# Altium footprint library B-NT_CHIPS.PcbLib: 90 footprints (part 4 of 6)
Each footprint in its own frame and in the unit in brackets; x right, y up, seen from the top. Pads: shape width x height; smd on the part's side, far side on the other; paste and mask are expansions set on the pad; w line width, h text height; cw(c..) or ccw(c..) is an arc to the next point about the centre after c.
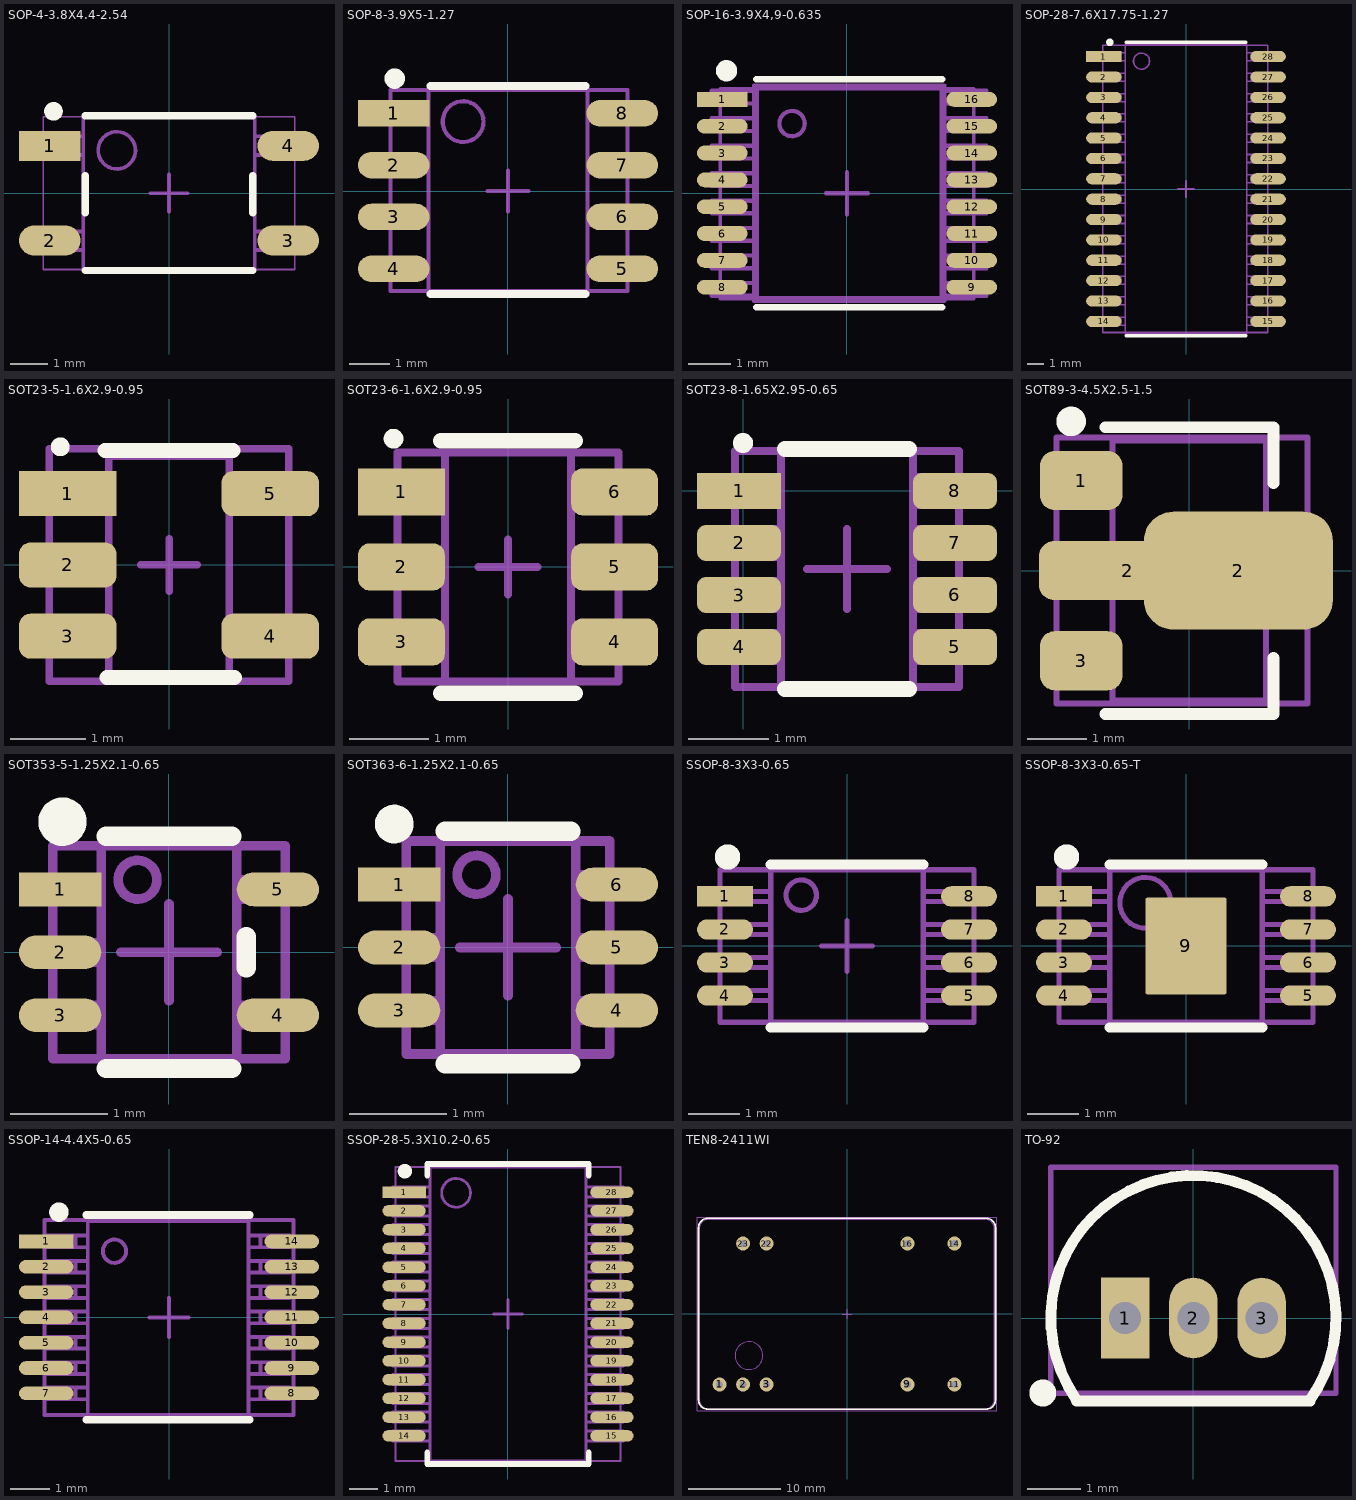
[diagram p3: the footprints below, top view; thin cyan lines are the x and y axes]

## SOP-4-3.8X4.4-2.54 [mm] "SOP, 4-Leads, Body 3,80x4,40mm, Pitch 2,54mm, IPC Medium Density"
height 2.3
pads (4):
  rect 1.65x0.8 smd: 1(-3.2,1.27)
  oval 1.65x0.8 smd: 2(-3.2,-1.27) 3(3.2,-1.27) 4(3.2,1.27)
Top Overlay:
  circle w0.25: c-3.1,2.195 r0.125
  lines w0.2: -2.25,-2.075 2.25,-2.075 ; -2.25,-0.525 -2.25,0.475 ; -2.25,2.075 2.25,2.075 ; 2.25,-0.525 2.25,0.475
M3 Top Assy:
  circle w0.1: c-1.4,1.15 r0.5
  lines w0.1: -2.3,-1.525 -3.35,-1.525 -3.35,-1.025 -2.3,-1.025 ; -2.3,1.025 -3.35,1.025 -3.35,1.525 -2.3,1.525 ; 2.3,-1.525 3.35,-1.525 3.35,-1.025 2.3,-1.025 ; 2.3,1.025 3.35,1.025 3.35,1.525 2.3,1.525 ; -2.3,-2.05 2.3,-2.05 2.3,2.05 -2.3,2.05 -2.3,-2.05
M8 Top Brd Anno:
  lines w0.05: -3.375,-2.05 3.375,-2.05 3.375,2.05 -3.375,2.05 -3.375,-2.05
  lines w0.1: -0.5,0 0.5,0 ; 0,-0.5 0,0.5
3D body "SOP254P680X230-4N.step": height 2.3, standoff 0, extent -3.375,-2.05 3.375,2.05

## SOP-8-3.9X5-1.27 [mm] "SOIC, 8-Leads, Body 5x4mm, Pitch 1.27mm, IPC Medium Density"
height 1.8
pads (8):
  rect 1.75x0.65 smd: 1(-2.8,1.905)
  oval 1.75x0.65 smd: 2(-2.8,0.635) 3(-2.8,-0.635) 4(-2.8,-1.905) 5(2.8,-1.905) 6(2.8,-0.635) 7(2.8,0.635) 8(2.8,1.905)
Top Overlay:
  circle w0.25: c-2.775,2.755 r0.125
  lines w0.2: -1.9,-2.525 1.9,-2.525 ; -1.9,2.575 1.9,2.575
M3 Top Assy:
  circle w0.1: c-1.1,1.7 r0.5
  lines w0.1: -1.95,-2.075 -3,-2.075 -3,-1.725 -1.95,-1.725 ; -1.95,-0.8 -3,-0.8 -3,-0.45 -1.95,-0.45 ; -1.95,0.475 -3,0.475 -3,0.825 -1.95,0.825 ; -1.95,1.725 -3,1.725 -3,2.075 -1.95,2.075 ; 1.95,-2.075 3,-2.075 3,-1.725 1.95,-1.725 ; 1.95,-0.825 3,-0.825 3,-0.475 1.95,-0.475 ; 1.95,0.45 3,0.45 3,0.8 1.95,0.8 ; 1.95,1.725 3,1.725 3,2.075 1.95,2.075 ; -1.95,-2.5 -1.95,2.5 1.95,2.5 1.95,-2.5 -1.95,-2.5
M8 Top Brd Anno:
  lines w0.1: -0.5,0 0.5,0 ; 0,-0.5 0,0.5 ; -2.875,-2.45 -2.875,2.475 2.925,2.475 2.925,-2.45 -2.875,-2.45
3D body "CircuitWorks-SO-8.step": height 1.45, standoff 0, extent -2.86,-2.443 2.918,2.459

## SOP-16-3.9X4,9-0.635 [mm] "QSOP, 16 Leads, Body 5x4mm (max), Pitch 0.635mm"
height 1.75
pads (16):
  rect 1.2x0.35 smd: 1(-2.95,2.222)
  oval 1.2x0.35 smd: 2(-2.95,1.587) 3(-2.95,0.953) 4(-2.95,0.318) 5(-2.95,-0.318) 6(-2.95,-0.953) 7(-2.95,-1.587) 8(-2.95,-2.222) 9(2.95,-2.222) 10(2.95,-1.587) 11(2.95,-0.953) 12(2.95,-0.318) 13(2.95,0.318) 14(2.95,0.953) 15(2.95,1.587) 16(2.95,2.222)
Top Overlay:
  circle w0.25: c-2.85,2.9 r0.125
  lines w0.152: -2.15,-2.7 2.25,-2.7 ; -2.15,2.7 2.25,2.7
M3 Top Assy:
  circle w0.1: c-1.3,1.65 r0.3
  lines w0.1: -2.789,-2.425 -2.789,-2.125 ; -2.789,-1.775 -2.789,-1.475 ; -2.789,-1.125 -2.789,-0.825 ; -2.789,-0.475 -2.789,-0.175 ; -2.789,0.175 -2.789,0.475 ; -2.789,0.825 -2.789,1.125 ; -2.789,1.475 -2.789,1.775 ; -2.789,2.125 -2.789,2.425 ; -2.745,-2.425 -2.745,-2.125 ; -2.745,-1.775 -2.745,-1.475 ; -2.745,-1.125 -2.745,-0.825 ; -2.745,-0.475 -2.745,-0.175 ; -2.745,0.175 -2.745,0.475 ; -2.745,0.825 -2.745,1.125 ; -2.745,1.475 -2.745,1.775 ; -2.745,2.125 -2.745,2.425 ; -2.643,-2.425 -2.643,-2.125 ; -2.643,-1.775 -2.643,-1.475 ; -2.643,-1.125 -2.643,-0.825 ; -2.643,-0.475 -2.643,-0.175 ; -2.643,0.175 -2.643,0.475 ; -2.643,0.825 -2.643,1.125 ; -2.643,1.475 -2.643,1.775 ; -2.643,2.125 -2.643,2.425 ; -2.45,-2.425 -2.45,-2.125 ; -2.45,-1.775 -2.45,-1.475 ; -2.45,-1.125 -2.45,-0.825 ; -2.45,-0.475 -2.45,-0.175 ; -2.45,0.175 -2.45,0.475 ; -2.45,0.825 -2.45,1.125 ; -2.45,1.475 -2.45,1.775 ; -2.45,2.125 -2.45,2.425 ; -2.2,-2.425 -3.2,-2.425 -3.2,-2.125 -2.2,-2.125 ; -2.2,-1.775 -3.2,-1.775 -3.2,-1.475 -2.2,-1.475 ; -2.2,-1.125 -3.2,-1.125 -3.2,-0.825 -2.2,-0.825 ; -2.2,-0.475 -3.2,-0.475 -3.2,-0.175 -2.2,-0.175 ; -2.2,0.175 -3.2,0.175 -3.2,0.475 -2.2,0.475 ; -2.2,0.825 -3.2,0.825 -3.2,1.125 -2.2,1.125 ; -2.2,1.475 -3.2,1.475 -3.2,1.775 -2.2,1.775 ; -2.2,2.125 -3.2,2.125 -3.2,2.425 -2.2,2.425 ; 2.3,-2.425 3.3,-2.425 3.3,-2.125 2.3,-2.125 ; 2.3,-1.775 3.3,-1.775 3.3,-1.475 2.3,-1.475 ; 2.3,-1.125 3.3,-1.125 3.3,-0.825 2.3,-0.825 ; 2.3,-0.475 3.3,-0.475 3.3,-0.175 2.3,-0.175 ; 2.3,0.175 3.3,0.175 3.3,0.475 2.3,0.475 ; 2.3,0.825 3.3,0.825 3.3,1.125 2.3,1.125 ; 2.3,1.475 3.3,1.475 3.3,1.775 2.3,1.775 ; 2.3,2.125 3.3,2.125 3.3,2.425 2.3,2.425 ; 2.55,-2.425 2.55,-2.125 ; 2.55,-1.775 2.55,-1.475 ; 2.55,-1.125 2.55,-0.825 ; 2.55,-0.475 2.55,-0.175 ; 2.55,0.175 2.55,0.475 ; 2.55,0.825 2.55,1.125 ; 2.55,1.475 2.55,1.775 ; 2.55,2.125 2.55,2.425 ; 2.743,-2.425 2.743,-2.125 ; 2.743,-1.775 2.743,-1.475 ; 2.743,-1.125 2.743,-0.825 ; 2.743,-0.475 2.743,-0.175 ; 2.743,0.175 2.743,0.475 ; 2.743,0.825 2.743,1.125 ; 2.743,1.475 2.743,1.775 ; 2.743,2.125 2.743,2.425 ; 2.845,-2.425 2.845,-2.125 ; 2.845,-1.775 2.845,-1.475 ; 2.845,-1.125 2.845,-0.825 ; 2.845,-0.475 2.845,-0.175 ; 2.845,0.175 2.845,0.475 ; 2.845,0.825 2.845,1.125 ; 2.845,1.475 2.845,1.775 ; 2.845,2.125 2.845,2.425 ; 2.889,-2.425 2.889,-2.125 ; 2.889,-1.775 2.889,-1.475 ; 2.889,-1.125 2.889,-0.825 ; 2.889,-0.475 2.889,-0.175 ; 2.889,0.175 2.889,0.475 ; 2.889,0.825 2.889,1.125 ; 2.889,1.475 2.889,1.775 ; 2.889,2.125 2.889,2.425 ; -2.2,-2.55 2.3,-2.55 ; -2.2,-2.55 -2.137,-2.487 ; -2.2,-2.55 -2.2,2.55 ; -2.2,2.55 -2.137,2.487 ; -2.2,2.55 2.3,2.55 ; -2.137,-2.487 2.237,-2.487 ; -2.137,-2.487 -2.137,2.487 ; -2.137,2.487 2.237,2.487 ; 2.237,-2.487 2.3,-2.55 ; 2.237,-2.487 2.237,2.487 ; 2.237,2.487 2.3,2.55 ; 2.3,-2.55 2.3,2.55
M8 Top Brd Anno:
  lines w0.076: -3,-2.5 3,-2.5 3,2.475 -3,2.475 -3,-2.5
  lines w0.1: -0.5,0 0.5,0 ; 0,-0.5 0,0.5
3D body "User Library-MAX_QSOP16.STEP": height 1.76, standoff -0.01, extent -3.01,-2.49 3.01,2.49

## SOP-28-7.6X17.75-1.27 [mm]
height 3
pads (28):
  rect 2.2x0.7 smd: 1(-5.125,8.255)
  oval 2.2x0.7 smd: 2(-5.125,6.985) 3(-5.125,5.715) 4(-5.125,4.445) 5(-5.125,3.175) 6(-5.125,1.905) 7(-5.125,0.635) 8(-5.125,-0.635) 9(-5.125,-1.905) 10(-5.125,-3.175) 11(-5.125,-4.445) 12(-5.125,-5.715) 13(-5.125,-6.985) 14(-5.125,-8.255) 15(5.125,-8.255) 16(5.125,-6.985) 17(5.125,-5.715) 18(5.125,-4.445) 19(5.125,-3.175) 20(5.125,-1.905) 21(5.125,-0.635) 22(5.125,0.635) 23(5.125,1.905) 24(5.125,3.175) 25(5.125,4.445) 26(5.125,5.715) 27(5.125,6.985) 28(5.125,8.255)
Top Overlay:
  circle w0.25: c-4.75,9.15 r0.103
  lines w0.2: -3.75,-9.15 3.75,-9.15 ; -3.75,9.15 3.75,9.15
M3 Top Assy:
  drawing of 313 lines, arcs and shapes, not listed
M8 Top Brd Anno:
  lines w0.1: -0.5,0 0.5,0 ; 0,-0.5 0,0.5 ; -5.2,-8.95 -5.2,8.975 5.1,8.975 5.1,-8.95 -5.2,-8.95
3D body "SW3dPS-SOIC28-300.STEP": height 2.65, standoff 0, extent -5.2,-8.95 5.1,8.95

## SOT23-5-1.6X2.9-0.95 [mm] "SOT, 6-Leads, Body 2,9x1,6mm, Pitch 0,95mm"
height 1.1
pads (5):
  rect 1.3x0.6 smd: 1(-1.35,0.95)
  rrect50% 1.3x0.6 smd: 2(-1.35,0) 3(-1.35,-0.95) 4(1.35,-0.95) 5(1.35,0.95)
Top Overlay:
  circle w0.15: c-1.45,1.575 r0.05
  lines w0.2: -0.85,1.525 0.85,1.525 ; -0.825,-1.5 0.875,-1.5
M3 Top Assy:
  lines w0.1: -0.8,-1.075 -1.4,-1.075 -1.4,-0.775 -0.8,-0.775 ; -0.8,-0.125 -1.4,-0.125 -1.4,0.175 -0.8,0.175 ; -0.8,0.825 -1.4,0.825 -1.4,1.125 -0.8,1.125 ; 0.8,-1.1 1.4,-1.1 1.4,-0.8 0.8,-0.8 ; 0.8,0.8 1.4,0.8 1.4,1.1 0.8,1.1 ; -0.8,-1.45 0.8,-1.45 0.8,1.45 -0.8,1.45 -0.8,-1.45
M8 Top Brd Anno:
  lines w0.1: -0.375,0 0.375,0 ; 0,-0.35 0,0.35 ; -1.6,-1.55 -1.6,1.55 1.6,1.55 1.6,-1.55 -1.6,-1.55
3D body "STEP-WE-TVS-HS-SOT23-6L-rev1.stp": height 1.06, standoff -0.1, extent -1.4,-1.45 1.4,1.45
3D body "User Library-SOT23-5-3.STEP": height 1.45, standoff 0.01, extent -1.6,-1.55 1.6,1.55

## SOT23-6-1.6X2.9-0.95 [mm] "SOT, 6-Leads, Body 2,9x1,6mm, Pitch 0,95mm"
height 1.1
pads (6):
  rect 1.1x0.6 smd: 1(-1.35,0.95)
  rrect50% 1.1x0.6 smd: 2(-1.35,0) 3(-1.35,-0.95) 4(1.35,-0.95) 5(1.35,0) 6(1.35,0.95)
Top Overlay:
  circle w0.15: c-1.45,1.625 r0.05
  lines w0.2: -0.85,-1.6 0.85,-1.6 ; -0.85,1.6 0.85,1.6
M3 Top Assy:
  lines w0.1: -0.8,-1.075 -1.4,-1.075 -1.4,-0.775 -0.8,-0.775 ; -0.8,-0.125 -1.4,-0.125 -1.4,0.175 -0.8,0.175 ; -0.8,0.825 -1.4,0.825 -1.4,1.125 -0.8,1.125 ; 0.8,-1.1 1.4,-1.1 1.4,-0.8 0.8,-0.8 ; 0.8,0.8 1.4,0.8 1.4,1.1 0.8,1.1 ; 0.825,-0.15 1.425,-0.15 1.425,0.15 0.825,0.15 ; -0.8,-1.45 -0.8,1.45 0.8,1.45 0.8,-1.45 -0.8,-1.45
M8 Top Brd Anno:
  lines w0.1: -0.375,0 0.375,0 ; 0,-0.35 0,0.35 ; -1.4,-1.45 1.4,-1.45 1.4,1.45 -1.4,1.45 -1.4,-1.45
3D body "STEP-WE-TVS-HS-SOT23-6L-rev1.stp": height 1.16, standoff 0, extent -1.4,-1.45 1.4,1.45
3D body "STEP-WE-TVS-HS-SOT23-6L-rev1.stp": height 1.06, standoff -0.1, extent -1.4,-1.45 1.4,1.45

## SOT23-8-1.65X2.95-0.65 [mm] "SOT23, 8-Leads, Body 2,95x1,65mm, Pitch 0,65mm, IPC Medium Density"
height 1.1
pads (8):
  rect 1.05x0.45 smd: 1(-0.05,0)
  rrect50% 1.05x0.45 smd: 2(-0.05,-0.65) 3(-0.05,-1.3) 4(-0.05,-1.95) 5(2.65,-1.95) 6(2.65,-1.3) 7(2.65,-0.65) 8(2.65,0)
Top Overlay:
  circle w0.15: c0,0.6 r0.05
  lines w0.2: 0.525,-2.475 2.075,-2.475 ; 0.525,0.525 2.075,0.525
M3 Top Assy:
  lines w0.1: 0.475,-2.125 -0.1,-2.125 -0.1,-1.775 0.475,-1.775 ; 0.475,-1.475 -0.1,-1.475 -0.1,-1.125 0.475,-1.125 ; 0.475,-0.825 -0.1,-0.825 -0.1,-0.475 0.475,-0.475 ; 0.475,-0.175 -0.1,-0.175 -0.1,0.175 0.475,0.175 ; 2.125,-2.125 2.7,-2.125 2.7,-1.775 2.125,-1.775 ; 2.125,-1.475 2.7,-1.475 2.7,-1.125 2.125,-1.125 ; 2.125,-0.825 2.7,-0.825 2.7,-0.475 2.125,-0.475 ; 2.125,-0.175 2.7,-0.175 2.7,0.175 2.125,0.175 ; 0.475,-2.45 2.125,-2.45 2.125,0.5 0.475,0.5 0.475,-2.45
M8 Top Brd Anno:
  lines w0.1: 0.8,-0.975 1.8,-0.975 ; 1.3,-1.475 1.3,-0.475 ; -0.1,-2.45 -0.1,0.5 2.7,0.5 2.7,-2.45 -0.1,-2.45
3D body "User Library-sot238.step": height 1.2, standoff 0, extent -0.1,-2.445 2.7,0.495

## SOT89-3-4.5X2.5-1.5 [mm] "SOT89, Body 4.5x2.5mm, Pitch 1.5mm"
height 1
pads (4):
  rrect50% 1.4x1 smd: 1(-1.829,1.524) 3(-1.829,-1.524)
  rrect50% 3x1 smd: 2(-1.042,0)
  rrect50% 3.2x2 smd: 2(0.829,0)
Top Overlay:
  circle w0.25: c-2,2.525 r0.125
  lines w0.2: -1.422,-2.426 1.425,-2.426 ; -1.422,2.426 1.422,2.426 1.422,1.478 ; 1.422,-2.426 1.422,-1.478
M3 Top Assy:
  lines w0.1: -1.3,-1.8 -2.025,-1.8 -2.025,-1.3 -1.3,-1.3 ; -1.3,-0.25 -2.025,-0.25 -2.025,0.25 -1.3,0.25 ; -1.3,1.3 -2.025,1.3 -2.025,1.8 -1.3,1.8 ; 1.3,-0.7 2.025,-0.7 2.025,0.7 1.3,0.7 ; -1.3,-2.2 1.3,-2.2 1.3,2.2 -1.3,2.2 -1.3,-2.2
M8 Top Brd Anno:
  lines w0.1: -0.5,0 0.5,0 ; 0,-0.5 0,0.5 ; -2.25,-2.25 2,-2.25 2,2.25 -2.25,2.25 -2.25,-2.25
3D body "User Library-SOT89-3.STEP": height 1.54, standoff 0, extent -2.25,-2.25 2,2.25

## SOT353-5-1.25X2.1-0.65 [mm] "SC-70-5, 0.65 PITCH"
height 2.3
pads (5):
  rect 0.85x0.35 smd: 1(-1.125,0.65)
  oval 0.85x0.35 smd: 2(-1.125,0) 3(-1.125,-0.65) 4(1.125,-0.65) 5(1.125,0.65)
Top Overlay:
  circle w0.25: c-1.1,1.35 r0.125
  lines w0.2: -0.65,-1.2 0.65,-1.2 ; -0.65,1.2 0.65,1.2 ; 0.8,-0.163 0.8,0.162
M3 Top Assy:
  circle w0.1: c-0.325,0.75 r0.2
  lines w0.1: -0.7,-0.75 -1.225,-0.75 -1.225,-0.55 -0.7,-0.55 ; -0.7,-0.1 -1.225,-0.1 -1.225,0.1 -0.7,0.1 ; -0.7,0.55 -1.225,0.55 -1.225,0.75 -0.7,0.75 ; 0.7,-0.75 1.225,-0.75 1.225,-0.55 0.7,-0.55 ; 0.7,0.55 1.225,0.55 1.225,0.75 0.7,0.75 ; -0.7,-1.1 0.7,-1.1 0.7,1.1 -0.7,1.1 -0.7,-1.1
M8 Top Brd Anno:
  lines w0.1: -0.5,0 0.5,0 ; 0,-0.5 0,0.5 ; -1.2,-1.1 1.2,-1.1 1.2,1.1 -1.2,1.1 -1.2,-1.1
3D body "SOT353.STEP": height 1.1, standoff 0, extent -1.2,-1.1 1.2,1.1

## SOT363-6-1.25X2.1-0.65 [mm] "TSOP, 6-Leads, Body 2,00x1,25mm, Pitch 0,65mm, IPC Medium Density"
height 1.1
pads (6):
  rect 0.85x0.35 smd: 1(-1.125,0.65)
  oval 0.85x0.35 smd: 2(-1.125,0) 3(-1.125,-0.65) 4(1.125,-0.65) 5(1.125,0) 6(1.125,0.65)
Top Overlay:
  circle w0.2: c-1.175,1.275 r0.1
  lines w0.2: -0.65,-1.2 0.65,-1.2 ; -0.65,1.2 0.65,1.2
M3 Top Assy:
  circle w0.1: c-0.325,0.75 r0.2
  lines w0.1: -0.7,-0.75 -1.225,-0.75 -1.225,-0.55 -0.7,-0.55 ; -0.7,-0.1 -1.225,-0.1 -1.225,0.1 -0.7,0.1 ; -0.7,0.55 -1.225,0.55 -1.225,0.75 -0.7,0.75 ; 0.7,-0.75 1.225,-0.75 1.225,-0.55 0.7,-0.55 ; 0.7,-0.1 1.225,-0.1 1.225,0.1 0.7,0.1 ; 0.7,0.55 1.225,0.55 1.225,0.75 0.7,0.75 ; -0.7,-1.1 -0.7,1.1 0.7,1.1 0.7,-1.1 -0.7,-1.1
M8 Top Brd Anno:
  lines w0.1: -0.5,0 0.5,0 ; 0,-0.5 0,0.5 ; -1.05,-1.1 1.05,-1.1 1.05,1.1 -1.05,1.1 -1.05,-1.1
3D body "TSOP65P210X110-6N.step": height 1.08, standoff -0.02, extent -1.05,-1.1 1.05,1.1

## SSOP-8-3X3-0.65 [mm] "MSOP, 8-Leads, Body 3,00x3,00mm, Pitch 0,65mm, IPC Medium Density"
height 1.2
pads (8):
  rect 1.1x0.4 smd: 1(-2.4,0.975)
  oval 1.1x0.4 smd: 2(-2.4,0.325) 3(-2.4,-0.325) 4(-2.4,-0.975) 5(2.4,-0.975) 6(2.4,-0.325) 7(2.4,0.325) 8(2.4,0.975)
Top Overlay:
  circle w0.25: c-2.35,1.75 r0.125
  lines w0.2: -1.5,-1.6 1.5,-1.6 ; -1.5,1.6 1.5,1.6
M3 Top Assy:
  circle w0.1: c-0.9,1 r0.3
  lines w0.1: -1.5,-1.075 -2.45,-1.075 -2.45,-0.875 -1.5,-0.875 ; -1.5,-0.425 -2.45,-0.425 -2.45,-0.225 -1.5,-0.225 ; -1.5,0.225 -2.45,0.225 -2.45,0.425 -1.5,0.425 ; -1.5,0.875 -2.45,0.875 -2.45,1.075 -1.5,1.075 ; 1.5,-1.075 2.45,-1.075 2.45,-0.875 1.5,-0.875 ; 1.5,-0.425 2.45,-0.425 2.45,-0.225 1.5,-0.225 ; 1.5,0.225 2.45,0.225 2.45,0.425 1.5,0.425 ; 1.5,0.875 2.45,0.875 2.45,1.075 1.5,1.075 ; -1.5,-1.5 1.5,-1.5 1.5,1.5 -1.5,1.5 -1.5,-1.5
M8 Top Brd Anno:
  lines w0.1: -0.5,0 0.5,0 ; 0,-0.5 0,0.5 ; -2.5,-1.5 2.5,-1.5 2.5,1.5 -2.5,1.5 -2.5,-1.5
3D body "User Library-MSOP-8-2.STEP": height 1.05, standoff -0.02, extent -2.51,-1.5 2.511,1.5

## SSOP-8-3X3-0.65-T [mm] "MSOP, 8-Leads, Body 3,00x3,00mm, Pitch 0,65mm, IPC Medium Density"
height 1.1
pads (9):
  rect 1.1x0.4 smd: 1(-2.4,0.975)
  oval 1.1x0.4 smd: 2(-2.4,0.325) 3(-2.4,-0.325) 4(-2.4,-0.975) 5(2.4,-0.975) 6(2.4,-0.325) 7(2.4,0.325) 8(2.4,0.975)
  rrect5% 1.6x1.9 smd: 9(0,0)
Top Overlay:
  circle w0.25: c-2.35,1.75 r0.125
  lines w0.2: -1.5,-1.6 1.5,-1.6 ; -1.5,1.6 1.5,1.6
M3 Top Assy:
  circle w0.1: c-0.8,0.85 r0.5
  lines w0.1: -1.5,-1.075 -2.45,-1.075 -2.45,-0.875 -1.5,-0.875 ; -1.5,-0.425 -2.45,-0.425 -2.45,-0.225 -1.5,-0.225 ; -1.5,0.225 -2.45,0.225 -2.45,0.425 -1.5,0.425 ; -1.5,0.875 -2.45,0.875 -2.45,1.075 -1.5,1.075 ; 1.5,-1.075 2.45,-1.075 2.45,-0.875 1.5,-0.875 ; 1.5,-0.425 2.45,-0.425 2.45,-0.225 1.5,-0.225 ; 1.5,0.225 2.45,0.225 2.45,0.425 1.5,0.425 ; 1.5,0.875 2.45,0.875 2.45,1.075 1.5,1.075 ; -1.5,-1.5 1.5,-1.5 1.5,1.5 -1.5,1.5 -1.5,-1.5
M8 Top Brd Anno:
  lines w0.1: -0.5,0 0.5,0 ; 0,-0.5 0,0.5 ; -2.5,-1.5 2.5,-1.5 2.5,1.5 -2.5,1.5 -2.5,-1.5
3D body "User Library-MSOP-8-2.STEP": height 1, standoff -0.07, extent -2.51,-1.5 2.511,1.5

## SSOP-14-4.4X5-0.65 [mm] "TSSOP, 14-Leads, Body 5.0x4.5mm (max), Pitch 0.65mm, IPC Medium Density"
height 1.2
pads (14):
  rect 1.4x0.35 smd: 1(-3.15,1.95)
  oval 1.4x0.35 smd: 2(-3.15,1.3) 3(-3.15,0.65) 4(-3.15,0) 5(-3.15,-0.65) 6(-3.15,-1.3) 7(-3.15,-1.95) 8(3.15,-1.95) 9(3.15,-1.3) 10(3.15,-0.65) 11(3.15,0) 12(3.15,0.65) 13(3.15,1.3) 14(3.15,1.95)
Top Overlay:
  circle w0.25: c-2.825,2.7 r0.125
  lines w0.2: -2.125,-2.625 2.075,-2.625 ; -2.125,2.625 2.075,2.625
M3 Top Assy:
  circle w0.1: c-1.4,1.7 r0.3
  lines w0.1: -2.739,-2.1 -2.739,-1.8 ; -2.739,-1.45 -2.739,-1.15 ; -2.739,-0.8 -2.739,-0.5 ; -2.739,-0.15 -2.739,0.15 ; -2.739,0.5 -2.739,0.8 ; -2.739,1.15 -2.739,1.45 ; -2.739,1.8 -2.739,2.1 ; -2.695,-2.1 -2.695,-1.8 ; -2.695,-1.45 -2.695,-1.15 ; -2.695,-0.8 -2.695,-0.5 ; -2.695,-0.15 -2.695,0.15 ; -2.695,0.5 -2.695,0.8 ; -2.695,1.15 -2.695,1.45 ; -2.695,1.8 -2.695,2.1 ; -2.593,-2.1 -2.593,-1.8 ; -2.593,-1.45 -2.593,-1.15 ; -2.593,-0.8 -2.593,-0.5 ; -2.593,-0.15 -2.593,0.15 ; -2.593,0.5 -2.593,0.8 ; -2.593,1.15 -2.593,1.45 ; -2.593,1.8 -2.593,2.1 ; -2.4,-2.1 -2.4,-1.8 ; -2.4,-1.45 -2.4,-1.15 ; -2.4,-0.8 -2.4,-0.5 ; -2.4,-0.15 -2.4,0.15 ; -2.4,0.5 -2.4,0.8 ; -2.4,1.15 -2.4,1.45 ; -2.4,1.8 -2.4,2.1 ; -2.15,-2.1 -3.15,-2.1 -3.15,-1.8 -2.15,-1.8 ; -2.15,-1.45 -3.15,-1.45 -3.15,-1.15 -2.15,-1.15 ; -2.15,-0.8 -3.15,-0.8 -3.15,-0.5 -2.15,-0.5 ; -2.15,-0.15 -3.15,-0.15 -3.15,0.15 -2.15,0.15 ; -2.15,0.5 -3.15,0.5 -3.15,0.8 -2.15,0.8 ; -2.15,1.15 -3.15,1.15 -3.15,1.45 -2.15,1.45 ; -2.15,1.8 -3.15,1.8 -3.15,2.1 -2.15,2.1 ; 2.1,-2.1 3.1,-2.1 3.1,-1.8 2.1,-1.8 ; 2.1,-1.45 3.1,-1.45 3.1,-1.15 2.1,-1.15 ; 2.1,-0.8 3.1,-0.8 3.1,-0.5 2.1,-0.5 ; 2.1,-0.15 3.1,-0.15 3.1,0.15 2.1,0.15 ; 2.1,0.5 3.1,0.5 3.1,0.8 2.1,0.8 ; 2.1,1.15 3.1,1.15 3.1,1.45 2.1,1.45 ; 2.1,1.8 3.1,1.8 3.1,2.1 2.1,2.1 ; 2.35,-2.1 2.35,-1.8 ; 2.35,-1.45 2.35,-1.15 ; 2.35,-0.8 2.35,-0.5 ; 2.35,-0.15 2.35,0.15 ; 2.35,0.5 2.35,0.8 ; 2.35,1.15 2.35,1.45 ; 2.35,1.8 2.35,2.1 ; 2.543,-2.1 2.543,-1.8 ; 2.543,-1.45 2.543,-1.15 ; 2.543,-0.8 2.543,-0.5 ; 2.543,-0.15 2.543,0.15 ; 2.543,0.5 2.543,0.8 ; 2.543,1.15 2.543,1.45 ; 2.543,1.8 2.543,2.1 ; 2.645,-2.1 2.645,-1.8 ; 2.645,-1.45 2.645,-1.15 ; 2.645,-0.8 2.645,-0.5 ; 2.645,-0.15 2.645,0.15 ; 2.645,0.5 2.645,0.8 ; 2.645,1.15 2.645,1.45 ; 2.645,1.8 2.645,2.1 ; 2.689,-2.1 2.689,-1.8 ; 2.689,-1.45 2.689,-1.15 ; 2.689,-0.8 2.689,-0.5 ; 2.689,-0.15 2.689,0.15 ; 2.689,0.5 2.689,0.8 ; 2.689,1.15 2.689,1.45 ; 2.689,1.8 2.689,2.1 ; -2.087,-2.525 -2.087,2.475 2.037,2.475 2.037,-2.525 -2.087,-2.525
M8 Top Brd Anno:
  lines w0.1: -0.5,0 0.5,0 ; 0,-0.5 0,0.5 ; -3.2,-2.5 -3.2,2.5 3.2,2.5 3.2,-2.5 -3.2,-2.5
3D body "User Library-TSSOP14-1.step": height 1.1, standoff 0, extent -3.2,-2.5 3.2,2.5

## SSOP-28-5.3X10.2-0.65 [mm] "28-SSOP (0.209\", 5.30mm Width)"
height 3
pads (28):
  rect 1.5x0.4 smd: 1(-3.6,4.225)
  oval 1.5x0.4 smd: 2(-3.6,3.575) 3(-3.6,2.925) 4(-3.6,2.275) 5(-3.6,1.625) 6(-3.6,0.975) 7(-3.6,0.325) 8(-3.6,-0.325) 9(-3.6,-0.975) 10(-3.6,-1.625) 11(-3.6,-2.275) 12(-3.6,-2.925) 13(-3.6,-3.575) 14(-3.6,-4.225) 15(3.6,-4.225) 16(3.6,-3.575) 17(3.6,-2.925) 18(3.6,-2.275) 19(3.6,-1.625) 20(3.6,-0.975) 21(3.6,-0.325) 22(3.6,0.325) 23(3.6,0.975) 24(3.6,1.625) 25(3.6,2.275) 26(3.6,2.925) 27(3.6,3.575) 28(3.6,4.225)
Top Overlay:
  circle w0.25: c-3.575,4.95 r0.125
  lines w0.2: -2.8,-4.8 -2.8,-5.2 2.8,-5.2 2.8,-4.8 ; -2.8,4.8 -2.8,5.2 2.8,5.2 2.8,4.8
M3 Top Assy:
  circle w0.1: c-1.8,4.2 r0.5
  lines w0.1: -2.75,-4.4 -4,-4.4 -4,-4.05 -2.75,-4.05 ; -2.75,-3.75 -4,-3.75 -4,-3.4 -2.75,-3.4 ; -2.75,-3.1 -4,-3.1 -4,-2.75 -2.75,-2.75 ; -2.75,-2.45 -4,-2.45 -4,-2.1 -2.75,-2.1 ; -2.75,-1.8 -4,-1.8 -4,-1.45 -2.75,-1.45 ; -2.75,-1.15 -4,-1.15 -4,-0.8 -2.75,-0.8 ; -2.75,-0.5 -4,-0.5 -4,-0.15 -2.75,-0.15 ; -2.75,0.15 -4,0.15 -4,0.5 -2.75,0.5 ; -2.75,0.8 -4,0.8 -4,1.15 -2.75,1.15 ; -2.75,1.45 -4,1.45 -4,1.8 -2.75,1.8 ; -2.75,2.1 -4,2.1 -4,2.45 -2.75,2.45 ; -2.75,2.75 -4,2.75 -4,3.1 -2.75,3.1 ; -2.75,3.4 -4,3.4 -4,3.75 -2.75,3.75 ; -2.75,4.05 -4,4.05 -4,4.4 -2.75,4.4 ; 2.75,-4.4 4,-4.4 4,-4.05 2.75,-4.05 ; 2.75,-3.75 4,-3.75 4,-3.4 2.75,-3.4 ; 2.75,-3.1 4,-3.1 4,-2.75 2.75,-2.75 ; 2.75,-2.45 4,-2.45 4,-2.1 2.75,-2.1 ; 2.75,-1.8 4,-1.8 4,-1.45 2.75,-1.45 ; 2.75,-1.15 4,-1.15 4,-0.8 2.75,-0.8 ; 2.75,-0.5 4,-0.5 4,-0.15 2.75,-0.15 ; 2.75,0.15 4,0.15 4,0.5 2.75,0.5 ; 2.75,0.8 4,0.8 4,1.15 2.75,1.15 ; 2.75,1.45 4,1.45 4,1.8 2.75,1.8 ; 2.75,2.1 4,2.1 4,2.45 2.75,2.45 ; 2.75,2.75 4,2.75 4,3.1 2.75,3.1 ; 2.75,3.4 4,3.4 4,3.75 2.75,3.75 ; 2.75,4.05 4,4.05 4,4.4 2.75,4.4 ; -2.7,-5.1 -2.7,5.1 2.7,5.1 2.7,-5.1 -2.7,-5.1
M8 Top Brd Anno:
  lines w0.076: -3.9,-5.1 3.9,-5.1 3.9,5.1 -3.9,5.1 -3.9,-5.1
  lines w0.1: -0.5,0 0.5,0 ; 0,-0.5 0,0.5
3D body "User Library-SSOP-28-3.STEP": height 1.9, standoff 0, extent -3.9,-5.1 3.9,5.1

## TEN8-2411WI [mil] "(31.8mm x 20.3mm x 10.2mm)"
height 401.57
pads (9):
  round 60 hole 30: 1(-542.52,-300) 2(-442.52,-300) 3(-342.52,-300) 9(257.48,-300) 11(457.48,-300) 14(457.48,300) 16(257.48,300) 22(-342.52,300) 23(-442.52,300)
Top Overlay:
  lines w7.87: -631.89,-366.14 ccw(c-592.52,-366.14) -592.52,-405.51 592.52,-405.51 ccw(c592.52,-366.14) 631.89,-366.14 631.89,368.11 ccw(c592.52,368.11) 592.52,407.48 -592.52,407.48 ccw(c-592.52,368.11) -631.89,368.11 -631.89,-366.14
M3 Top Assy:
  circle w3.94: c-417.32,-177.17 r59.06
  lines w3.94: -629.92,-366.14 -629.92,365.16 ; -629.92,-363.19 ccw(c-590.55,-363.19) -590.55,-402.56 ; -629.92,362.21 cw(c-590.55,362.21) -590.55,401.58 ; -593.5,-402.56 591.54,-402.56 ; -593.5,402.56 591.54,402.56 ; 588.58,-402.56 ccw(c588.58,-363.19) 627.95,-363.19 ; 588.58,401.58 cw(c588.58,362.21) 627.95,362.21 ; 627.95,-366.14 627.95,365.16
M8 Top Brd Anno:
  lines w3.94: -638.77,-411.42 -638.77,411.42 637.8,411.42 ; -637.81,-411.42 638.76,-411.42 638.76,411.42 ; -19.69,0 19.68,0 ; -0.01,-19.69 -0.01,19.68
3D body "TEN8WI Series.STEP": height 400, standoff -149.61, extent -625.01,-400 624.99,400

## TO-92 [mm] "TO-92"
height 5
pads (3):
  rect 0.9x1.5 hole 0.6: 1(-1.27,0)
  oval 0.9x1.5 hole 0.6: 2(0,0) 3(1.27,0)
Top Overlay:
  circle w0.25: c-2.8,-1.393 r0.125
  lines w0.2: -2.189,-1.493 cw(c0,0) 2.169,-1.522 ; -2.17,-1.543 2.169,-1.543
M3 Top Assy:
  lines w0.1: -2.189,-1.543 2.17,-1.543 ; -2.189,-1.493 cw(c0,0) 2.17,-1.522 ; -1.47,-0.2 -1.47,0.225 -1.07,0.225 -1.07,-0.2 -1.47,-0.2 ; -0.2,-0.2 -0.2,0.225 0.2,0.225 0.2,-0.2 -0.2,-0.2 ; 1.07,-0.2 1.07,0.225 1.47,0.225 1.47,-0.2 1.07,-0.2
M8 Top Brd Anno:
  lines w0.1: -2.65,-1.4 2.65,-1.4 2.65,2.8 -2.65,2.8 -2.65,-1.4
3D body "TO-92.STEP": height 17.5, standoff -1.3, extent -2.65,-1.4 2.65,2.8